# Altium footprint library E-Stall_lib.PcbLib: 112 footprints (part 3 of 7)
Each footprint in its own frame and in the unit in brackets; x right, y up, seen from the top. Pads: shape width x height; smd on the part's side, far side on the other; paste and mask are expansions set on the pad; w line width, h text height; cw(c..) or ccw(c..) is an arc to the next point about the centre after c.
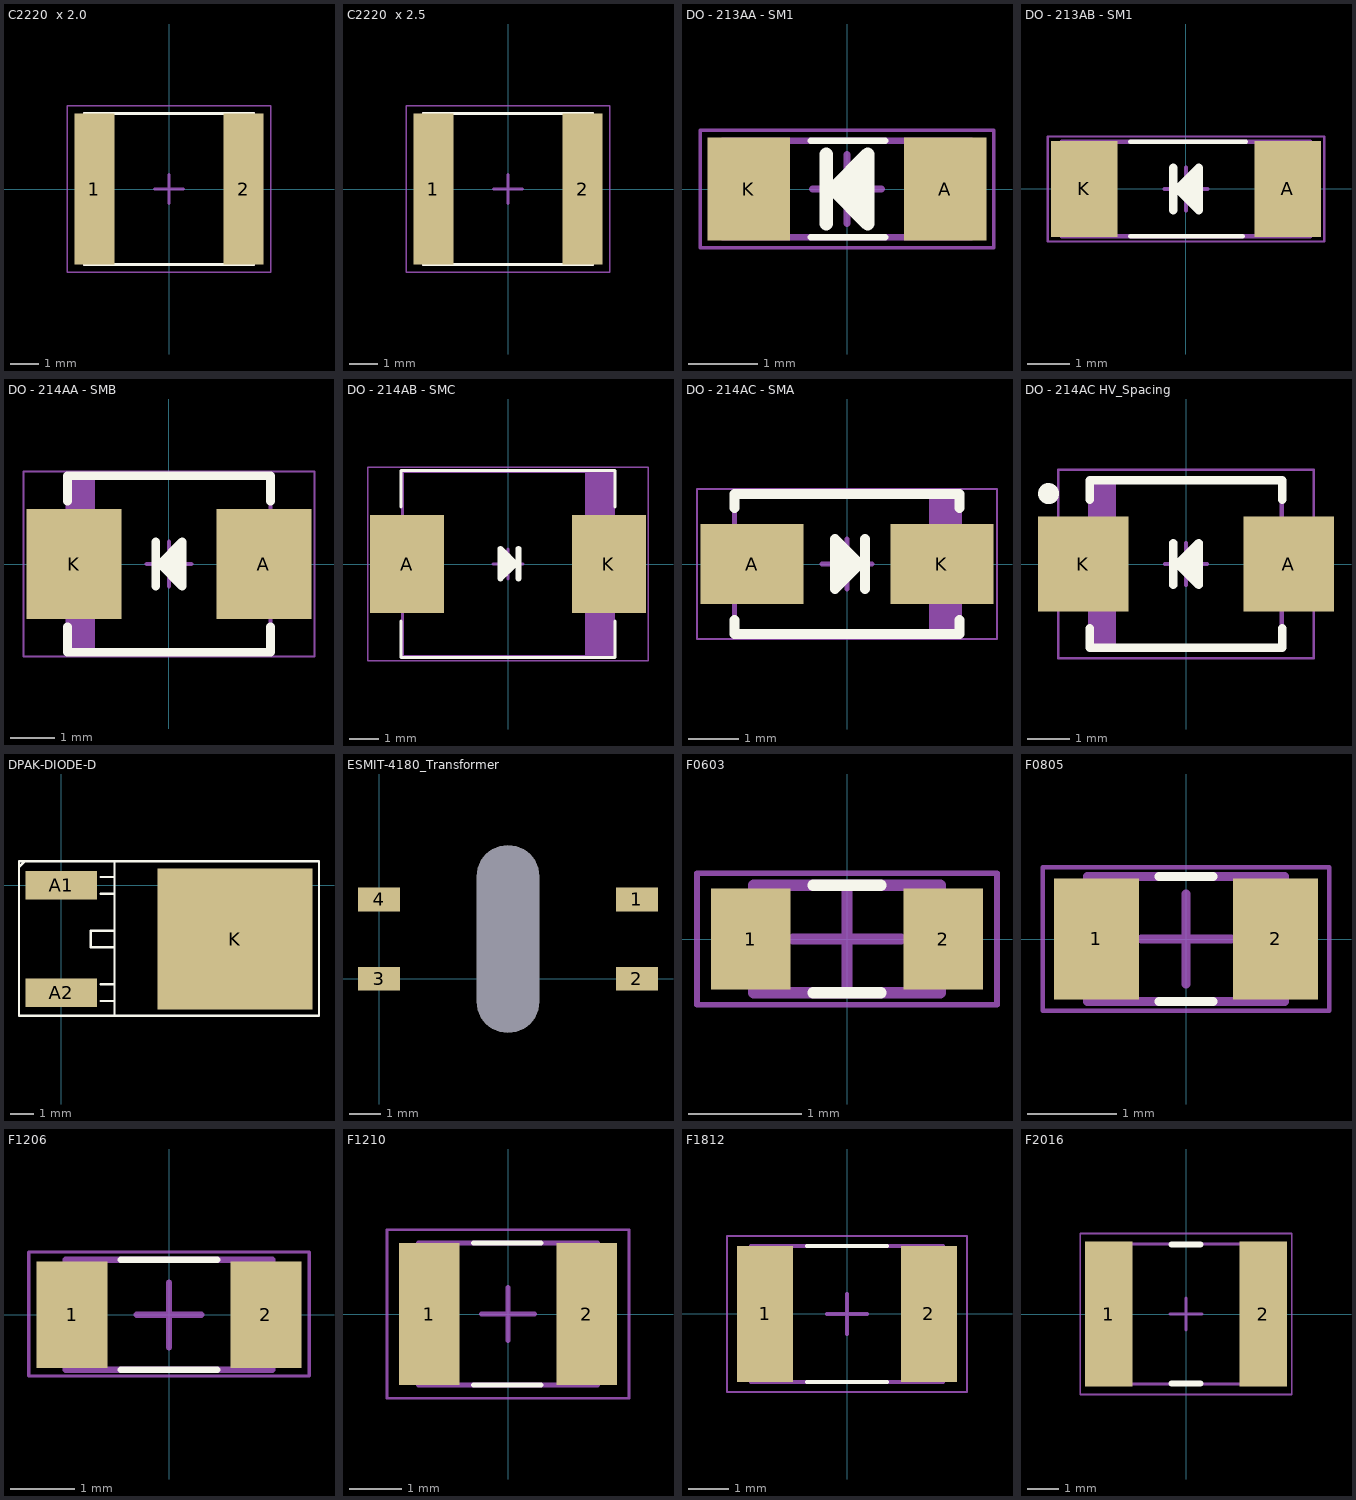
[diagram p2: the footprints below, top view; thin cyan lines are the x and y axes]

## C2220  x 2.0 [mm] "Chip Capacitor, 2-Leads, Body 5,70x5,00mm, IPC Medium Density"
height 2
pads (2):
  rect 1.4x5.25 smd: 1(-2.6,0) 2(2.6,0)
Top Overlay:
  lines w0.1: -2.95,-2.625 2.95,-2.625 2.95,2.625 -2.95,2.625 -2.95,-2.625
Mechanical 13:
  lines w0.1: -2.95,-2.625 2.95,-2.625 2.95,2.625 -2.95,2.625 -2.95,-2.625
Mechanical 15:
  lines w0.05: -3.55,-2.9 3.55,-2.9 3.55,2.9 -3.55,2.9 -3.55,-2.9
  lines w0.1: -0.5,0 0.5,0 ; 0,-0.5 0,0.5
3D body "CAPC5750X33N.step": height 3.3, standoff 0, extent -2.95,-2.625 2.95,2.625

## C2220  x 2.5 [mm] "Chip Capacitor, 2-Leads, Body 5,70x5,00mm, IPC Medium Density"
height 2.5
pads (2):
  rect 1.4x5.25 smd: 1(-2.6,0) 2(2.6,0)
Top Overlay:
  lines w0.1: -2.95,-2.625 -2.95,2.625 2.95,2.625 2.95,-2.625 -2.95,-2.625
Mechanical 13:
  lines w0.1: -2.95,-2.625 -2.95,2.625 2.95,2.625 2.95,-2.625 -2.95,-2.625
Mechanical 15:
  lines w0.05: -3.55,-2.9 -3.55,2.9 3.55,2.9 3.55,-2.9 -3.55,-2.9
  lines w0.1: -0.5,0 0.5,0 ; 0,-0.5 0,0.5
3D body "CAPC5750X33N.step": height 3.3, standoff 0, extent -2.95,-2.625 2.95,2.625

## DO - 213AA - SM1 [mm] "MELF Diode, 2-Leads, Body 3,50x1,35mm, IPC High Density"
height 1.4
pads (2):
  rect 1.2x1.5 smd: A(1.425,0) K(-1.425,0)
Top Overlay:
  lines w0.1: -0.52,-0.7 0.55,-0.7 ; -0.52,0.7 0.55,0.7 ; -0.3,0 0.3,0 ; 0.05,0.25 0.158,0.358 ; 0.158,-0.358 0.3,-0.5
  lines w0.15: 0.158,-0.358 0.158,0.358
  lines w0.2: -0.3,-0.5 -0.3,0.5 ; 0.05,-0.25 0.05,0.25 ; -0.2,0 0.3,0.5 0.3,-0.5 -0.2,0
Mechanical 13:
  lines w0.1: -1.8,-0.7 -1.8,0.7 1.8,0.7 1.8,-0.7 -1.8,-0.7
Mechanical 15:
  lines w0.05: -2.125,-0.85 -2.125,0.85 2.125,0.85 2.125,-0.85 -2.125,-0.85
  lines w0.1: -0.5,0 0.5,0 ; 0,-0.5 0,0.5
3D body "SOD-80 MiniMELF.stp": height 1.65, standoff 0.05, extent -1.85,-0.8 1.85,0.8

## DO - 213AB - SM1 [mm] "MELF Diode, 2-Leads, Body 5,73x2,10mm, IPC High Density"
height 2.2
pads (2):
  rect 1.55x2.25 smd: A(2.375,0) K(-2.375,0)
Top Overlay:
  lines w0.1: -1.3,-1.1 1.325,-1.1 ; -1.3,1.1 1.4,1.1 ; -0.3,0 0.3,0 ; 0.05,0.25 0.158,0.358 ; 0.158,-0.358 0.3,-0.5
  lines w0.15: 0.158,-0.358 0.158,0.358
  lines w0.2: -0.3,-0.5 -0.3,0.5 ; 0.05,-0.25 0.05,0.25 ; -0.2,0 0.3,0.5 0.3,-0.5 -0.2,0
Mechanical 13:
  lines w0.1: -2.9,-1.1 -2.9,1.1 2.9,1.1 2.9,-1.1 -2.9,-1.1
Mechanical 15:
  lines w0.05: -3.225,-1.225 -3.225,1.225 3.225,1.225 3.225,-1.225 -3.225,-1.225
  lines w0.1: -0.5,0 0.5,0 ; 0,-0.5 0,0.5
3D body "DO-213_AB.stp": height 2.45, standoff -0.05, extent -2.5,-1.25 2.5,1.24

## DO - 214AA - SMB [mm] "Molded Diode, 2-Leads, Body 4,32x3,63mm, IPC High Density"
height 2.65
pads (2):
  rect 2.15x2.5 smd: A(2.15,0) K(-2.15,0)
Top Overlay:
  lines w0.1: -0.3,0 0.3,0 ; 0.05,0.25 0.158,0.358 ; 0.158,-0.358 0.3,-0.5
  lines w0.15: 0.158,-0.358 0.158,0.358
  lines w0.2: -2.3,-1.425 -2.3,-2 2.3,-2 2.3,-1.425 ; -2.3,1.425 -2.3,2 2.3,2 2.3,1.425 ; -0.3,-0.5 -0.3,0.5 ; 0.05,-0.25 0.05,0.25 ; -0.2,0 0.3,-0.5 0.3,0.5 -0.2,0
Mechanical 13:
  region: -1.681,1.975 -2.3,1.975 -2.3,-1.975 -1.681,-1.975
  lines w0.1: -2.3,-1.975 -2.3,1.975 2.3,1.975 2.3,-1.975 -2.3,-1.975
Mechanical 15:
  lines w0.05: -3.3,-2.1 -3.3,2.1 3.3,2.1 3.3,-2.1 -3.3,-2.1
  lines w0.1: -0.5,0 0.5,0 ; 0,-0.5 0,0.5
3D body "smb.STEP": height 2.45, standoff 0.03, extent -2.75,-1.95 2.75,1.95

## DO - 214AB - SMC [mm] "Molded Diode, 2-Leads, Body 6,85x5,90mm, IPC High Density"
height 2.62
pads (2):
  rect 2.5x3.3 smd: A(-3.4,0) K(3.4,0)
Top Overlay:
  lines w0.1: -3.6,-1.925 -3.6,-3.15 3.6,-3.15 3.6,-1.925 ; -3.6,1.925 -3.6,3.15 3.6,3.15 3.6,1.925 ; -0.25,0.012 0.35,0.012 ; -0.25,0.512 -0.108,0.37 ; -0.108,-0.345 0,-0.238
  lines w0.2: -0.108,-0.345 -0.108,0.37 ; 0,-0.238 0,0.262 ; 0.35,-0.487 0.35,0.512 ; -0.25,-0.487 -0.25,0.512 0.25,0.012 -0.25,-0.487
Mechanical 13:
  rectangle: 2.599,-3.11 3.555,3.11
  lines w0.1: -3.555,-3.11 -3.555,3.11 3.555,3.11 3.555,-3.11 -3.555,-3.11
Mechanical 15:
  lines w0.05: -4.725,-3.25 -4.725,3.25 4.725,3.25 4.725,-3.25 -4.725,-3.25
  lines w0.1: -0.5,0 0.5,0 ; 0,-0.5 0,0.5
3D body "SMC DO-214AB.STEP": height 2.67, standoff 0.03, extent -4.064,-3.15 4.064,3.15

## DO - 214AC - SMA [mm] "Molded Diode, 2-Leads, Body 4,25x2,67mm, IPC High Density"
height 2.29
pads (2):
  rect 2.05x1.6 smd: A(-1.9,0) K(1.9,0)
Top Overlay:
  lines w0.1: -0.242,0 0.358,0 ; -0.242,0.5 -0.1,0.358 ; -0.1,-0.358 0.008,-0.25
  lines w0.15: -0.1,-0.358 -0.1,0.358
  lines w0.2: -2.25,-1.125 -2.25,-1.4 2.25,-1.4 2.25,-1.125 ; -2.25,1.125 -2.25,1.4 2.25,1.4 2.25,1.125 ; 0.008,-0.25 0.008,0.25 ; 0.358,-0.5 0.358,0.5 ; -0.242,-0.5 -0.242,0.5 0.258,0 -0.242,-0.5
Mechanical 13:
  rectangle: 1.645,-1.395 2.25,1.395
  lines w0.1: -2.25,-1.395 2.25,-1.395 2.25,1.395 -2.25,1.395 -2.25,-1.395
Mechanical 15:
  lines w0.05: -3,-1.5 3,-1.5 3,1.5 -3,1.5 -3,-1.5
  lines w0.1: -0.5,0 0.5,0 ; 0,-0.5 0,0.5
3D body "SMA DO-214AC.STEP": height 2.15, standoff 0.01, extent -2.553,-1.333 2.553,1.334

## DO - 214AC HV_Spacing [mm] "DO-214 1.2kV SiC-Diode , 2-Leads, Body 4,31x3,62mm, IPC Medium Density"
height 2.44
pads (2):
  rect 2.16x2.26 smd: A(2.45,0) K(-2.45,0)
Top Overlay:
  circle w0.25: c-3.28,1.68 r0.125
  lines w0.1: -0.3,0 0.3,0 ; 0.05,0.25 0.158,0.358 ; 0.158,-0.358 0.3,-0.5
  lines w0.15: 0.158,-0.358 0.158,0.358
  lines w0.2: -2.3,-1.53 -2.3,-2 2.3,-2 2.3,-1.53 ; -2.3,1.53 -2.3,2 2.3,2 2.3,1.53 ; -0.3,-0.5 -0.3,0.5 ; 0.05,-0.25 0.05,0.25 ; -0.2,0 0.3,0.5 0.3,-0.5 -0.2,0
Mechanical 13:
  rectangle: -2.285,-1.97 -1.67,1.97
  lines w0.1: -2.285,-1.97 2.285,-1.97 2.285,1.97 -2.285,1.97 -2.285,-1.97
Mechanical 15:
  lines w0.05: -3.05,-2.25 3.05,-2.25 3.05,2.25 -3.05,2.25 -3.05,-2.25
  lines w0.1: -0.5,0 0.5,0 ; 0,-0.5 0,0.5
3D body "DO-214 HV_Spacing.step": height 2.44, standoff 0, extent -2.505,-1.97 2.505,1.97

## DPAK-DIODE-D [mm] "DPAK Diode Doppelt"
pads (3):
  rect 3x1.2 smd: A1(0,0) A2(0,-4.5)
  rect 6.5x5.9 smd: K(7.275,-2.25)
Top Overlay:
  lines w0.102: -1.778,0.762 -1.524,1.016 ; 1.65,-4.85 2.225,-4.85 ; 1.65,-4.15 2.225,-4.15 ; 1.65,-0.35 2.225,-0.35 ; 1.65,0.35 2.225,0.35 ; 2.225,-5.45 2.225,0.95 ; 2.225,-2.6 1.225,-2.6 1.225,-1.9 2.225,-1.9 ; -1.778,-5.461 -1.778,1.016 10.795,1.016 10.795,-5.461 -1.778,-5.461
3D body: height 0.51, standoff 0, extent -0.254,-0.504 0.965,0.461
3D body: height 1.52, standoff 0, extent 0.66,-0.504 0.965,0.461
3D body: height 1.52, standoff 1.02, extent 0.66,-0.504 2.388,0.461
3D body: height 1.52, standoff 1.02, extent 0.66,-5.004 2.388,-4.039
3D body: height 1.52, standoff 0, extent 0.66,-5.004 0.965,-4.039
3D body: height 1.27, standoff 0, extent 8.128,-4.978 9.982,0.559
3D body: height 0.51, standoff 0, extent -0.254,-5.004 0.965,-4.039
3D body: height 2, standoff 0, extent 2.184,-5.182 8.255,0.66
3D body: height 2.38, standoff 1.27, extent 2.184,-5.182 8.255,0.669
3D body: height 2.03, standoff 0, extent 4.521,-0.279 6.909,0.559

## ESMIT-4180_Transformer [mm] "Sumida_ESMIT-4180 isoSPI Transformer"
pads (5):
  rect 1.35x0.76 smd: 1(8.25,2.54) 2(8.25,0) 3(0,0) 4(0,2.54)
  oval 0.675x0 hole 2 slot 6 at 90 deg unplated: 7(4.125,1.275)
3D body "Sumida ESMIT-4180A.stp": height 3.5, standoff 0, extent -0.445,-1.325 8.695,3.875

## F0603 [mm] "Chip Fuse, 2-Leads, Body 1,57x0,85mm, IPC High Density"
height 0.5
pads (2):
  rect 0.7x0.89 smd: 1(-0.85,0) 2(0.85,0)
Top Overlay:
  lines w0.1: -0.3,-0.475 0.3,-0.475 ; -0.3,0.475 0.3,0.475
Mechanical 13:
  lines w0.1: -0.825,-0.475 -0.825,0.475 0.825,0.475 0.825,-0.475 -0.825,-0.475
Mechanical 15:
  lines w0.05: -1.325,-0.58 -1.325,0.58 1.325,0.58 1.325,-0.58 -1.325,-0.58
  lines w0.1: -0.475,0 0.475,0 ; 0,-0.475 0,0.475
3D body "SMD_Polyfuse_0603.stp": height 0.39, standoff 0.01, extent -0.8,-0.4 0.8,0.4

## F0805 [mm] "Chip Fuse, 2-Leads, Body 2,05x1,25mm, IPC High Density"
height 0.5
pads (2):
  rect 0.95x1.35 smd: 1(-1,0) 2(1,0)
Top Overlay:
  lines w0.1: -0.3,-0.7 0.3,-0.7 ; -0.3,0.7 0.3,0.7
Mechanical 13:
  lines w0.1: -1.1,-0.7 -1.1,0.7 1.1,0.7 1.1,-0.7 -1.1,-0.7
Mechanical 15:
  lines w0.05: -1.6,-0.8 -1.6,0.8 1.6,0.8 1.6,-0.8 -1.6,-0.8
  lines w0.1: -0.5,0 0.5,0 ; 0,-0.5 0,0.5
3D body "SMD_Polyfuse_0805.stp": height 0.54, standoff 0.01, extent -1.05,-0.675 1.05,0.675

## F1206 [mm] "Fuse 1206"
pads (2):
  rect 1.1x1.65 smd: 1(-1.5,0) 2(1.5,0)
Top Overlay:
  lines w0.1: -0.75,-0.85 0.75,-0.85 ; -0.75,0.85 0.75,0.85
Mechanical 13:
  lines w0.1: -1.6,-0.85 -1.6,0.85 1.6,0.85 1.6,-0.85 -1.6,-0.85
Mechanical 15:
  lines w0.05: -2.175,-0.95 -2.175,0.975 1.9,0.975 2.175,0.975 2.175,-0.95 1.9,-0.95 -2.175,-0.95
  lines w0.1: -0.5,0 0.5,0 ; 0,-0.5 0,0.5
3D body "SMD_Polyfuse_1206.stp": height 0.59, standoff 0.01, extent -1.6,-0.825 1.6,0.825

## F1210 [mm] "Chip Fuse, 2-Leads, Body 3,20x2,50mm, IPC Medium Density"
height 0.5
pads (2):
  rect 1.15x2.7 smd: 1(-1.5,0) 2(1.5,0)
Top Overlay:
  lines w0.1: -0.65,-1.35 0.625,-1.35 ; -0.65,1.35 0.625,1.35
Mechanical 13:
  lines w0.1: -1.7,-1.35 -1.7,1.35 1.7,1.35 1.7,-1.35 -1.7,-1.35
Mechanical 15:
  lines w0.05: -2.3,-1.6 -2.3,1.6 2.3,1.6 2.3,-1.6 -2.3,-1.6
  lines w0.1: -0.5,0 0.5,0 ; 0,-0.5 0,0.5
3D body "SMD_Polyfuse_1210.stp": height 0.59, standoff 0.01, extent -1.6,-1.275 1.6,1.275

## F1812 [mm] "Chip Fuse, 2-Leads, Body 4,50x3,20mm, IPC Medium Density"
height 1
pads (2):
  rect 1.4x3.4 smd: 1(-2.05,0) 2(2.05,0)
Top Overlay:
  lines w0.1: -1,-1.7 1,-1.7 ; -1,1.7 1,1.7
Mechanical 13:
  lines w0.1: -2.4,-1.7 -2.4,1.7 2.4,1.7 2.4,-1.7 -2.4,-1.7
Mechanical 15:
  lines w0.05: -3,-1.95 -3,1.95 3,1.95 3,-1.95 -3,-1.95
  lines w0.1: -0.5,0 0.5,0 ; 0,-0.5 0,0.5
3D body "SMD_Polyfuse_1812.stp": height 0.59, standoff 0.01, extent -2.25,-1.6 2.25,1.6

## F2016 [mm]
height 2
pads (2):
  rect 1.5x4.6 smd: 1(-2.45,0) 2(2.45,0)
Top Overlay:
  lines w0.2: -0.45,-2.2 0.45,-2.2 ; -0.45,2.2 0.45,2.2
Mechanical 13:
  lines w0.1: -2.72,-2.215 2.72,-2.215 2.72,2.215 -2.72,2.215 -2.72,-2.215
Mechanical 15:
  lines w0.05: -3.35,-2.55 3.35,-2.55 3.35,2.55 -3.35,2.55 -3.35,-2.55
  lines w0.1: -0.5,0 0.5,0 ; 0,-0.5 0,0.5
3D body "SMD_Polyfuse_2016.stp": height 0.59, standoff 0.01, extent -2.5,-2 2.5,2